# Altium footprint library 4.01-SH1.0连接器.PcbLib: 20 footprints (part 1 of 2)
Each footprint in its own frame and in the unit in brackets; x right, y up, seen from the top. Pads: shape width x height; smd on the part's side, far side on the other; paste and mask are expansions set on the pad; w line width, h text height; cw(c..) or ccw(c..) is an arc to the next point about the centre after c.
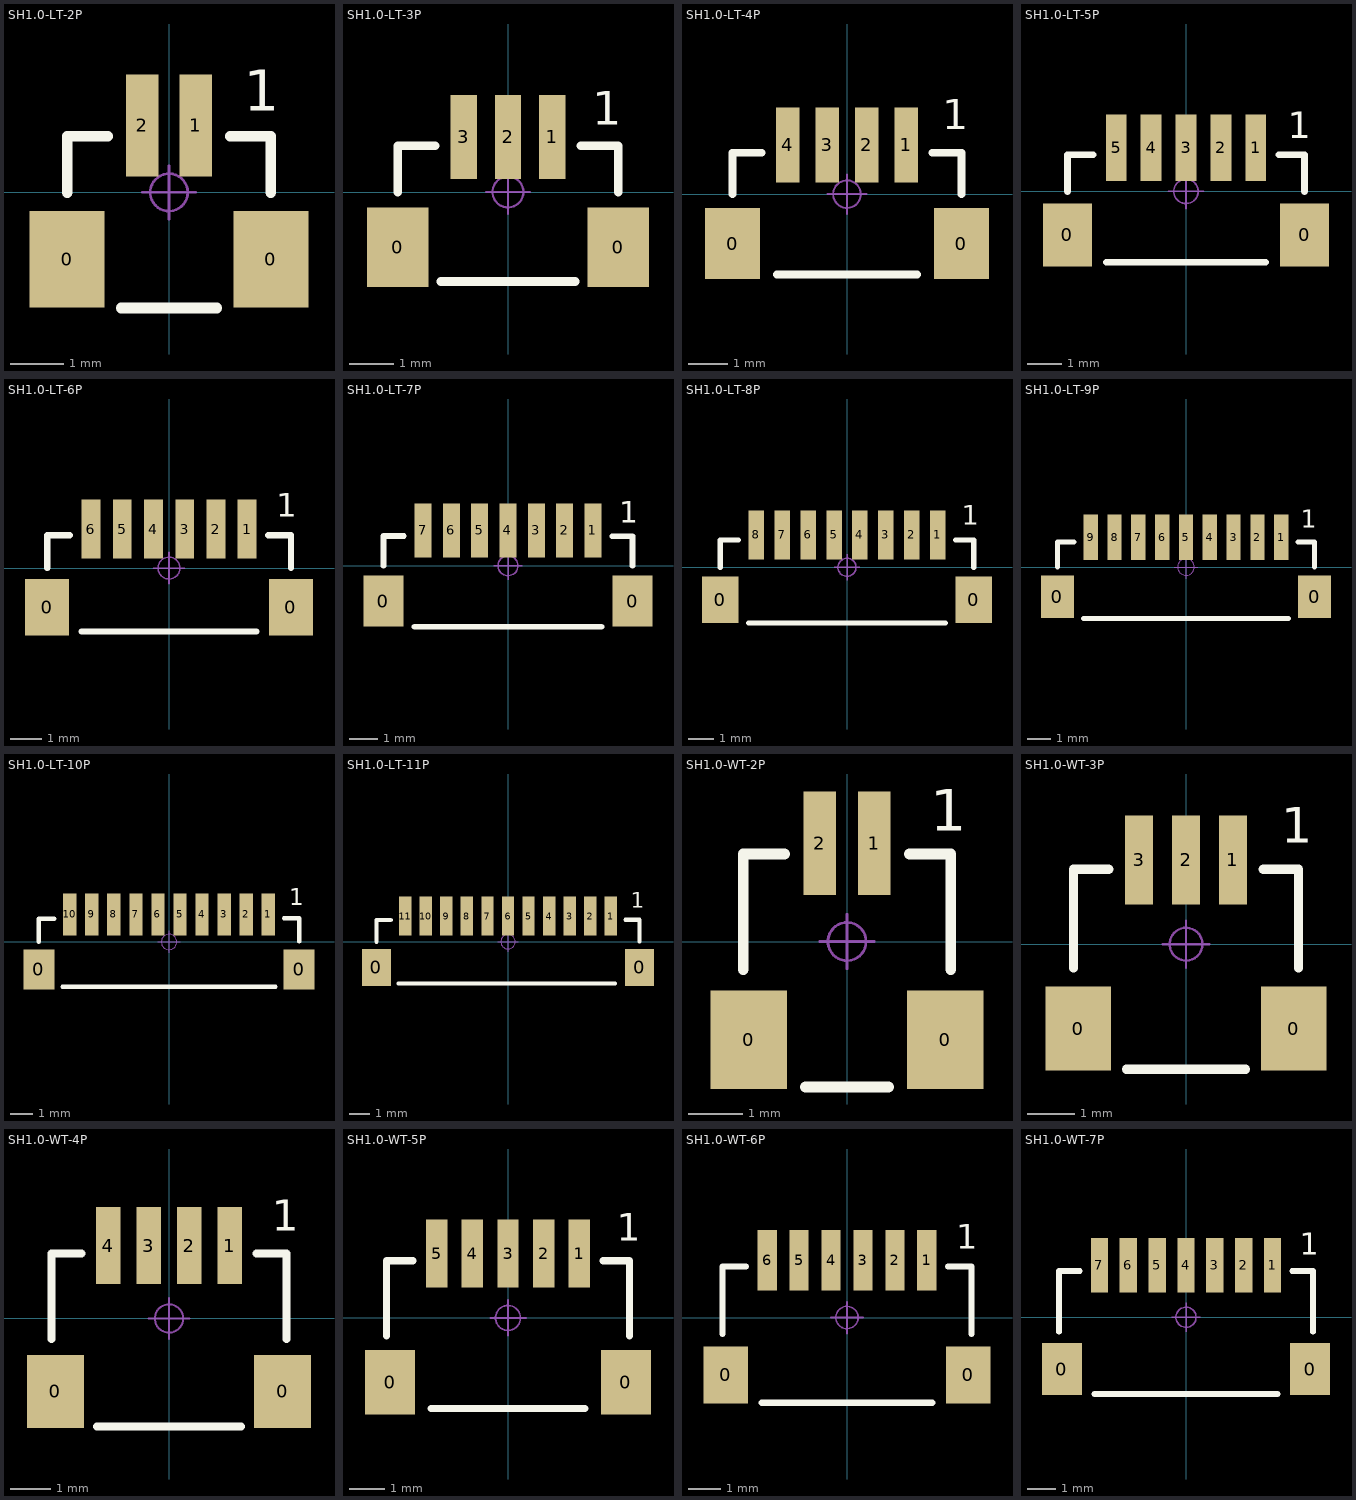
[diagram p0: the footprints below, top view; thin cyan lines are the x and y axes]

## SH1.0-LT-2P [mm] "SH1.0连接器-立贴-2P"
pads (4):
  rect 1.4x1.8 smd: 0(-1.9,-1.25) 0(1.9,-1.25)
  rect 0.6x1.9 smd: 1(0.5,1.25) 2(-0.5,1.25)
Top Overlay:
  lines w0.2: -1.9,0 -1.9,1.05 -1.143,1.05 ; -0.889,-2.159 0.889,-2.159 ; 1.143,1.05 1.9,1.05 1.9,0
  text "1" at 1.397,1.524 h0.76
Mechanical 15:
  circle w0.05: c0,0 r0.35
  lines w0.05: -0.5,0 0.5,0 ; 0,-0.5 0,0.5
3D body "SH1.0-LT-2P.STEP": height 4.25, standoff 0, extent -2,-1.905 2,1.695

## SH1.0-LT-3P [mm] "SH1.0连接器-立贴-3P                联系卖家 免费查找封装"
pads (5):
  rect 1.4x1.8 smd: 0(-2.5,-1.25) 0(2.5,-1.25)
  rect 0.6x1.9 smd: 1(1,1.25) 2(0,1.25) 3(-1,1.25)
Top Overlay:
  lines w0.2: -2.5,0 -2.5,1.05 -1.651,1.05 ; -1.524,-2.032 1.524,-2.032 ; 1.651,1.05 2.5,1.05 2.5,0
  text "1" at 1.905,1.524 h0.76
Mechanical 15:
  circle w0.05: c0,0 r0.35
  lines w0.05: -0.5,0 0.5,0 ; 0,-0.5 0,0.5
3D body "SH1.0-LT-3P.STEP": height 4.25, standoff 0, extent -2.5,-1.822 2.5,1.778

## SH1.0-LT-4P [mm] "SH1.0连接器-立贴-4P                联系卖家 免费查找封装"
pads (6):
  rect 1.4x1.8 smd: 0(-2.9,-1.25) 0(2.9,-1.25)
  rect 0.6x1.9 smd: 1(1.5,1.25) 2(0.5,1.25) 3(-0.5,1.25) 4(-1.5,1.25)
Top Overlay:
  lines w0.2: -2.9,0 -2.9,1.05 -2.159,1.05 ; -1.778,-2.032 1.778,-2.032 ; 2.159,1.05 2.9,1.05 2.9,0
  text "1" at 2.413,1.651 h0.76
Mechanical 15:
  circle w0.05: c0,0 r0.35
  lines w0.05: -0.5,0 0.5,0 ; 0,-0.5 0,0.5
3D body "SH1.0-LT-4P.STEP": height 4.25, standoff 0, extent -3,-1.905 3,1.695

## SH1.0-LT-5P [mm] "SH1.0连接器-立贴-5P                 联系卖家 免费查找封装"
pads (7):
  rect 1.4x1.8 smd: 0(-3.4,-1.25) 0(3.4,-1.25)
  rect 0.6x1.9 smd: 1(2,1.25) 2(1,1.25) 3(0,1.25) 4(-1,1.25) 5(-2,1.25)
Top Overlay:
  lines w0.2: -3.4,0 -3.4,1.05 -2.667,1.05 ; -2.286,-2.032 2.286,-2.032 ; 2.667,1.05 3.4,1.05 3.4,0
  text "1" at 2.921,1.524 h0.76
Mechanical 15:
  circle w0.05: c0,0 r0.35
  lines w0.05: -0.5,0 0.5,0 ; 0,-0.5 0,0.5
3D body "SH1.0-05.STEP": height 4.25, standoff 0, extent -3.5,-1.905 3.5,1.695

## SH1.0-LT-6P [mm] "SH1.0连接器-立贴-6P           来自淘宝卖家ID：黄晶宝石"
pads (8):
  rect 1.4x1.8 smd: 0(-3.9,-1.25) 0(3.9,-1.25)
  rect 0.6x1.9 smd: 1(2.5,1.25) 2(1.5,1.25) 3(0.5,1.25) 4(-0.5,1.25) 5(-1.5,1.25) 6(-2.5,1.25)
Top Overlay:
  lines w0.2: -3.9,0 -3.9,1.05 -3.175,1.05 ; -2.794,-2.032 2.794,-2.032 ; 3.175,1.05 3.9,1.05 3.9,0
  text "1" at 3.429,1.651 h0.76
Mechanical 15:
  circle w0.05: c0,0 r0.35
  lines w0.05: -0.5,0 0.5,0 ; 0,-0.5 0,0.5
3D body "SH1.0-06b.STEP": height 4.25, standoff 0, extent -4,-1.905 4,1.695

## SH1.0-LT-7P [mm] "SH1.0连接器-立贴-7P      来自淘宝卖家ID：黄晶宝石"
pads (9):
  rect 1.4x1.8 smd: 0(-4.401,-1.249) 0(4.401,-1.251)
  rect 0.6x1.9 smd: 1(2.999,1.251) 2(1.999,1.251) 3(0.999,1.251) 4(-0.001,1.251) 5(-1.001,1.251) 6(-2.001,1.251) 7(-3.001,1.251)
Top Overlay:
  lines w0.2: -4.401,0 -4.401,1.051 -3.683,1.051 ; -3.302,-2.159 3.302,-2.159 ; 3.683,1.049 4.401,1.049 4.401,0
  text "1" at 3.937,1.524 h0.76
Mechanical 15:
  circle w0.05: c0,0 r0.35
  lines w0.05: -0.5,0 0.5,0 ; 0,-0.5 0,0.5
3D body "SH1.0-LT-7P.STEP": height 4.25, standoff 0, extent -4.5,-2.032 4.5,1.568

## SH1.0-LT-8P [mm] "SH1.0连接器-立贴-8P"
pads (10):
  rect 1.4x1.8 smd: 0(-4.9,-1.25) 0(4.9,-1.25)
  rect 0.6x1.9 smd: 1(3.5,1.25) 2(2.5,1.25) 3(1.5,1.25) 4(0.5,1.25) 5(-0.5,1.25) 6(-1.5,1.25) 7(-2.5,1.25) 8(-3.5,1.25)
Top Overlay:
  lines w0.2: -4.9,0 -4.9,1.05 -4.191,1.05 ; -3.81,-2.159 3.81,-2.159 ; 4.191,1.05 4.9,1.05 4.9,0
  text "1" at 4.445,1.651 h0.76
Mechanical 15:
  circle w0.05: c0,0 r0.35
  lines w0.05: -0.5,0 0.5,0 ; 0,-0.5 0,0.5
3D body "LED 0603玻璃罩.": height 0, standoff 0, extent 0,0 0,0
3D body "SH1.0-LT-8P.STEP": height 4.25, standoff 0, extent -5,-2.032 5,1.568

## SH1.0-LT-9P [mm] "SH1.0连接器-立贴-9P           来自淘宝卖家ID：黄晶宝石"
pads (11):
  rect 1.4x1.8 smd: 0(-5.401,-1.249) 0(5.401,-1.251)
  rect 0.6x1.9 smd: 1(3.999,1.251) 2(2.999,1.251) 3(1.999,1.251) 4(0.999,1.251) 5(-0.001,1.251) 6(-1.001,1.251) 7(-2.001,1.251) 8(-3.001,1.251) 9(-4.001,1.251)
Top Overlay:
  lines w0.2: -5.401,0 -5.401,1.051 -4.699,1.051 ; -4.318,-2.159 4.318,-2.159 ; 4.699,1.049 5.401,1.049 5.401,0
  text "1" at 4.826,1.651 h0.76
Mechanical 15:
  circle w0.05: c0,0 r0.35
  lines w0.05: -0.5,0 0.5,0 ; 0,-0.5 0,0.5
3D body "LED 0603玻璃罩.": height 0, standoff 0, extent 0,0 0,0
3D body "SH1.0-LT-9P.STEP": height 4.25, standoff 0, extent -5.5,-2.032 5.5,1.568

## SH1.0-LT-10P [mm] "SH1.0连接器-立贴-10P           来自淘宝卖家ID：黄晶宝石"
pads (12):
  rect 1.4x1.8 smd: 0(-5.9,-1.25) 0(5.9,-1.25)
  rect 0.6x1.9 smd: 1(4.5,1.25) 2(3.5,1.25) 3(2.5,1.25) 4(1.5,1.25) 5(0.5,1.25) 6(-0.5,1.25) 7(-1.5,1.25) 8(-2.5,1.25) 9(-3.5,1.25) 10(-4.5,1.25)
Top Overlay:
  lines w0.2: -5.9,0 -5.9,1.05 -5.207,1.05 ; -4.826,-2.032 4.826,-2.032 ; 5.212,1.067 5.905,1.067 5.905,0.017
  text "1" at 5.461,1.651 h0.76
Mechanical 15:
  circle w0.05: c0,0 r0.35
  lines w0.05: -0.5,0 0.5,0 ; 0,-0.5 0,0.5
3D body "SH1.0-LT-10P.STEP": height 4.25, standoff 0, extent -6,-1.949 6,1.651

## SH1.0-LT-11P [mm] "SH1.0连接器-立贴-11P      来自淘宝卖家ID：黄晶宝石"
pads (13):
  rect 1.4x1.8 smd: 0(-6.4,-1.25) 0(6.4,-1.25)
  rect 0.6x1.9 smd: 1(5,1.25) 2(4,1.25) 3(3,1.25) 4(2,1.25) 5(1,1.25) 6(0,1.25) 7(-1,1.25) 8(-2,1.25) 9(-3,1.25) 10(-4,1.25) 11(-5,1.25)
Top Overlay:
  lines w0.2: -6.4,0 -6.4,1.05 -5.707,1.05 ; -5.326,-2.032 5.215,-2.032 ; 5.712,1.067 6.405,1.067 6.405,0.017
  text "1" at 5.969,1.651 h0.76
Mechanical 15:
  circle w0.05: c0,0 r0.35
  lines w0.05: -0.5,0 0.5,0 ; 0,-0.5 0,0.5
3D body "SH1.0-LT-11P.STEP": height 4.25, standoff 0, extent -6.5,-1.905 6.5,1.695

## SH1.0-WT-2P [mm] "SH1.0连接器-卧贴-2P                联系卖家 免费查找封装"
pads (4):
  rect 1.4x1.8 smd: 0(-1.8,-1.8) 0(1.8,-1.8)
  rect 0.6x1.9 smd: 1(0.5,1.8) 2(-0.5,1.8)
Top Overlay:
  lines w0.2: -1.9,-0.508 -1.9,1.6 -1.143,1.6 ; -0.762,-2.667 0.762,-2.667 ; 1.143,1.6 1.8,1.6 1.9,1.6 1.9,1.5 1.9,-0.508
  text "1" at 1.524,2.032 h0.76
Mechanical 15:
  circle w0.05: c0,0 r0.35
  lines w0.05: -0.5,0 0.5,0 ; 0,-0.5 0,0.5
3D body "SH1.0-WT-2P.STEP": height 2.9, standoff 0, extent -2,-2.667 2,2.283

## SH1.0-WT-3P [mm] "SH1.0连接器-卧贴-3P                 联系卖家 免费查找封装"
pads (5):
  rect 1.4x1.8 smd: 0(-2.3,-1.8) 0(2.3,-1.8)
  rect 0.6x1.9 smd: 1(1,1.8) 2(0,1.8) 3(-1,1.8)
Top Overlay:
  lines w0.2: -2.4,-0.508 -2.4,1.6 -1.651,1.6 ; -1.27,-2.667 1.27,-2.667 ; 1.651,1.6 2.3,1.6 2.4,1.6 2.4,1.5 2.4,-0.508
  text "1" at 2.032,2.159 h0.76
Mechanical 15:
  circle w0.05: c0,0 r0.35
  lines w0.05: -0.5,0 0.5,0 ; 0,-0.5 0,0.5
3D body "SH1.0-WT-3P.STEP": height 2.9, standoff 0, extent -2.5,-2.664 2.5,2.286

## SH1.0-WT-4P [mm] "SH1.0连接器-卧贴-4P          来自淘宝卖家ID：黄晶宝石"
pads (6):
  rect 1.4x1.8 smd: 0(-2.8,-1.8) 0(2.8,-1.8)
  rect 0.6x1.9 smd: 1(1.5,1.8) 2(0.5,1.8) 3(-0.5,1.8) 4(-1.5,1.8)
Top Overlay:
  lines w0.2: -2.9,-0.508 -2.9,1.6 -2.159,1.6 ; -1.778,-2.667 1.778,-2.667 ; 2.159,1.6 2.8,1.6 2.9,1.6 2.9,1.5 2.9,-0.508
  text "1" at 2.54,2.159 h0.76
Mechanical 15:
  circle w0.05: c0,0 r0.35
  lines w0.05: -0.5,0 0.5,0 ; 0,-0.5 0,0.5
3D body "SH1.0-WT-4P.STEP": height 2.9, standoff 0, extent -3,-2.6 3,2.35

## SH1.0-WT-5P [mm] "SH1.0连接器-卧贴-5P          来自淘宝卖家ID：黄晶宝石"
pads (7):
  rect 1.4x1.8 smd: 0(-3.3,-1.8) 0(3.3,-1.8)
  rect 0.6x1.9 smd: 1(2,1.8) 2(1,1.8) 3(0,1.8) 4(-1,1.8) 5(-2,1.8)
Top Overlay:
  lines w0.2: -3.4,-0.508 -3.4,1.6 -2.667,1.6 ; -2.159,-2.54 2.159,-2.54 ; 2.667,1.6 3.3,1.6 3.4,1.6 3.4,1.5 3.4,-0.508
  text "1" at 3.048,2.159 h0.76
Mechanical 15:
  circle w0.05: c0,0 r0.35
  lines w0.05: -0.5,0 0.5,0 ; 0,-0.5 0,0.5
3D body "SH1.0-05b.STEP": height 2.9, standoff 0, extent -3.5,-2.5 3.5,2.45

## SH1.0-WT-6P [mm] "SH1.0连接器-卧贴-6P                 联系卖家 免费查找封装"
pads (8):
  rect 1.4x1.8 smd: 0(-3.8,-1.8) 0(3.8,-1.8)
  rect 0.6x1.9 smd: 1(2.5,1.8) 2(1.5,1.8) 3(0.5,1.8) 4(-0.5,1.8) 5(-1.5,1.8) 6(-2.5,1.8)
Top Overlay:
  lines w0.2: -3.9,-0.508 -3.9,1.6 -3.175,1.6 ; -2.667,-2.667 2.667,-2.667 ; 3.175,1.6 3.8,1.6 3.9,1.6 3.9,1.588 3.9,-0.508
  text "1" at 3.429,2.159 h0.76
Mechanical 15:
  circle w0.05: c0,0 r0.35
  lines w0.05: -0.5,0 0.5,0 ; 0,-0.5 0,0.5
3D body "SH1.0-WT-6P.STEP": height 2.9, standoff 0, extent -4,-2.599 4,2.351

## SH1.0-WT-7P [mm] "SH1.0连接器-卧贴-7P"
pads (9):
  rect 1.4x1.8 smd: 0(-4.3,-1.8) 0(4.3,-1.8)
  rect 0.6x1.9 smd: 1(3,1.8) 2(2,1.8) 3(1,1.8) 4(0,1.8) 5(-1,1.8) 6(-2,1.8) 7(-3,1.8)
Top Overlay:
  lines w0.2: -4.4,-0.508 -4.4,1.6 -3.683,1.6 ; -3.175,-2.667 3.175,-2.667 ; 3.683,1.6 4.3,1.6 4.4,1.6 4.4,1.5 4.4,-0.508
  text "1" at 3.937,2.159 h0.76
Mechanical 15:
  circle w0.05: c0,0 r0.35
  lines w0.05: -0.5,0 0.5,0 ; 0,-0.5 0,0.5
3D body "LED 0603玻璃罩.": height 0, standoff 0, extent 0,0 0,0
3D body "SH1.0-WT-7P.STEP": height 2.9, standoff 0, extent -4.508,-2.599 4.492,2.351